# Altium footprint library LDCN Components.PcbLib: 426 footprints (part 23 of 27)
Each footprint in its own frame and in the unit in brackets; x right, y up, seen from the top. Pads: shape width x height; smd on the part's side, far side on the other; paste and mask are expansions set on the pad; w line width, h text height; cw(c..) or ccw(c..) is an arc to the next point about the centre after c.
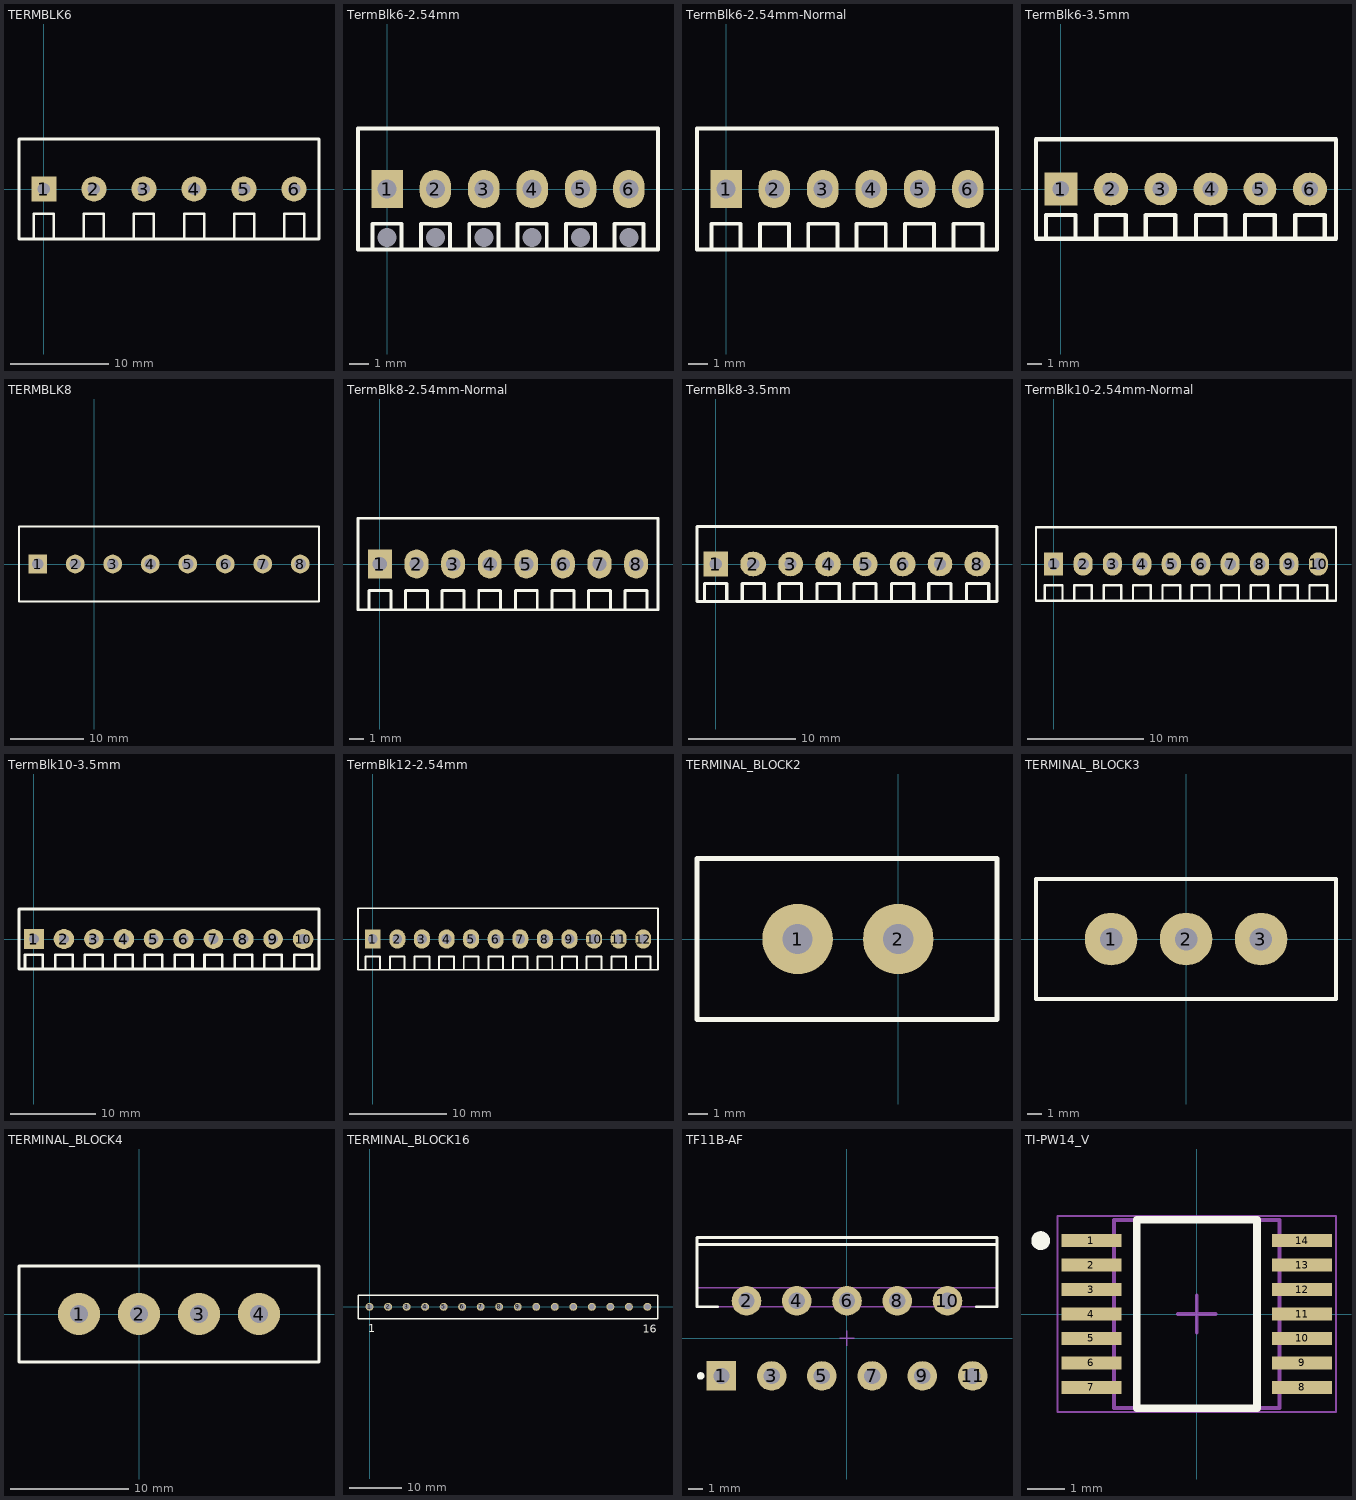
[diagram p22: the footprints below, top view; thin cyan lines are the x and y axes]

## TERMBLK6 [mm]
pads (6):
  rect 2.54x2.54 hole 1.27: 1(0,0)
  round 2.54 hole 1.27: 2(5.08,0) 3(10.16,0) 4(15.26,0) 5(20.34,0) 6(25.42,0)
Top Overlay:
  lines w0.254: -1.016,-5.08 -1.016,-2.54 1.016,-2.54 1.016,-5.08 ; 4.064,-5.08 4.064,-2.54 6.096,-2.54 6.096,-5.08 ; 9.144,-5.08 9.144,-2.54 11.176,-2.54 11.176,-5.08 ; 14.244,-5.08 14.244,-2.54 16.276,-2.54 16.276,-5.08 ; 19.324,-5.08 19.324,-2.54 21.356,-2.54 21.356,-5.08 ; 24.404,-5.08 24.404,-2.54 26.436,-2.54 26.436,-5.08
  lines w0.305: 12.7,-5.08 -2.54,-5.08 -2.54,5.08 12.7,5.08 ; 12.72,-5.08 27.96,-5.08 27.96,5.08 12.72,5.08

## TermBlk6-2.54mm [mm]
height 8
pads (12):
  rect 0x0 hole 1 unplated: 0(0,-2.54) 0(2.54,-2.54) 0(5.08,-2.54) 0(7.62,-2.54) 0(10.16,-2.54) 0(12.7,-2.54)
  rect 1.651x2 hole 1: 1(0,0)
  oval 1.651x2 hole 1: 2(2.54,0) 3(5.08,0) 4(7.62,0) 5(10.16,0) 6(12.7,0)
Top Overlay:
  lines w0.203: -0.762,-3.175 -0.762,-1.825 0.762,-1.825 0.762,-3.175 ; 1.778,-3.175 1.778,-1.825 3.302,-1.825 3.302,-3.175 ; 4.318,-3.175 4.318,-1.825 5.842,-1.825 5.842,-3.175 ; 6.858,-3.175 6.858,-1.825 8.382,-1.825 8.382,-3.175 ; 9.398,-3.175 9.398,-1.825 10.922,-1.825 10.922,-3.175 ; 11.938,-3.175 11.938,-1.825 13.462,-1.825 13.462,-3.175 ; -1.524,-3.175 14.224,-3.175 14.224,3.175 -1.524,3.175 -1.524,-3.175

## TermBlk6-2.54mm-Normal [mm]
height 8
pads (6):
  rect 1.651x2 hole 1: 1(0,0)
  oval 1.651x2 hole 1: 2(2.54,0) 3(5.08,0) 4(7.62,0) 5(10.16,0) 6(12.7,0)
Top Overlay:
  lines w0.203: -0.762,-3.175 -0.762,-1.825 0.762,-1.825 0.762,-3.175 ; 1.778,-3.175 1.778,-1.825 3.302,-1.825 3.302,-3.175 ; 4.318,-3.175 4.318,-1.825 5.842,-1.825 5.842,-3.175 ; 6.858,-3.175 6.858,-1.825 8.382,-1.825 8.382,-3.175 ; 9.398,-3.175 9.398,-1.825 10.922,-1.825 10.922,-3.175 ; 11.938,-3.175 11.938,-1.825 13.462,-1.825 13.462,-3.175 ; -1.524,-3.175 -1.524,3.175 14.224,3.175 14.224,-3.175 -1.524,-3.175

## TermBlk6-3.5mm [mm]
height 10
pads (6):
  rect 2.3x2.3 hole 1.15: 1(0,0)
  oval 2.4x2.3 hole 1.15: 2(3.5,0) 4(10.5,0) 6(17.47,0)
  round 2.3 hole 1.15: 3(7,0) 5(13.97,0)
Top Overlay:
  lines w0.305: -1.05,-3.5 -1.05,-1.825 1.025,-1.825 1.025,-3.5 ; 2.475,-3.5 2.475,-1.825 4.55,-1.825 4.55,-3.5 ; 5.95,-3.5 5.95,-1.825 8.025,-1.825 8.025,-3.5 ; 9.475,-3.5 9.475,-1.825 11.55,-1.825 11.55,-3.5 ; 12.92,-3.5 12.92,-1.825 14.995,-1.825 14.995,-3.5 ; 16.445,-3.5 16.445,-1.825 18.52,-1.825 18.52,-3.5 ; -1.75,-3.5 -1.75,3.5 19.304,3.5 19.304,-3.5 -1.75,-3.5

## TERMBLK8 [mil]
height 19
pads (8):
  rect 100x100 hole 60: 1(-300,0)
  round 100 hole 60: 2(-100,0) 3(100,0) 4(300,0) 5(500,0) 6(700,0) 7(900,0) 8(1100,0)
Top Overlay:
  lines w12: -400,-200 -400,200 1200,200 1200,-200 -400,-200

## TermBlk8-2.54mm-Normal [mm]
height 10
pads (8):
  rect 1.651x2 hole 1: 1(0,0)
  oval 1.651x2 hole 1: 2(2.54,0) 3(5.08,0) 4(7.62,0) 5(10.16,0) 6(12.7,0) 7(15.24,0) 8(17.78,0)
Top Overlay:
  lines w0.203: -0.762,-3.175 -0.762,-1.825 0.762,-1.825 0.762,-3.175 ; 1.778,-3.175 1.778,-1.825 3.302,-1.825 3.302,-3.175 ; 4.318,-3.175 4.318,-1.825 5.842,-1.825 5.842,-3.175 ; 6.858,-3.175 6.858,-1.825 8.382,-1.825 8.382,-3.175 ; 9.398,-3.175 9.398,-1.825 10.922,-1.825 10.922,-3.175 ; 11.938,-3.175 11.938,-1.825 13.462,-1.825 13.462,-3.175 ; 14.478,-3.175 14.478,-1.825 16.002,-1.825 16.002,-3.175 ; 17.018,-3.175 17.018,-1.825 18.542,-1.825 18.542,-3.175 ; -1.524,-3.175 19.304,-3.175 19.304,3.175 -1.524,3.175 -1.524,-3.175

## TermBlk8-3.5mm [mm]
height 10
pads (8):
  rect 2.3x2.3 hole 1.15: 1(0,0)
  oval 2.4x2.3 hole 1.15: 2(3.5,0) 4(10.5,0) 6(17.47,0) 8(24.47,0)
  round 2.3 hole 1.15: 3(7,0) 5(13.97,0) 7(20.97,0)
Top Overlay:
  lines w0.305: -1.05,-3.5 -1.05,-1.825 1.025,-1.825 1.025,-3.5 ; 2.475,-3.5 2.475,-1.825 4.55,-1.825 4.55,-3.5 ; 5.95,-3.5 5.95,-1.825 8.025,-1.825 8.025,-3.5 ; 9.475,-3.5 9.475,-1.825 11.55,-1.825 11.55,-3.5 ; 12.92,-3.5 12.92,-1.825 14.995,-1.825 14.995,-3.5 ; 16.445,-3.5 16.445,-1.825 18.52,-1.825 18.52,-3.5 ; 19.92,-3.5 19.92,-1.825 21.995,-1.825 21.995,-3.5 ; 23.445,-3.5 23.445,-1.825 25.52,-1.825 25.52,-3.5 ; -1.75,-3.5 -1.75,3.5 26.3,3.5 26.3,-3.5 -1.75,-3.5

## TermBlk10-2.54mm-Normal [mm]
height 10
pads (10):
  rect 1.651x2 hole 1: 1(0,0)
  oval 1.651x2 hole 1: 2(2.54,0) 3(5.08,0) 4(7.62,0) 5(10.16,0) 6(12.7,0) 7(15.24,0) 8(17.78,0) 9(20.32,0) 10(22.86,0)
Top Overlay:
  lines w0.203: -0.762,-3.175 -0.762,-1.825 0.762,-1.825 0.762,-3.175 ; 1.778,-3.175 1.778,-1.825 3.302,-1.825 3.302,-3.175 ; 4.318,-3.175 4.318,-1.825 5.842,-1.825 5.842,-3.175 ; 6.858,-3.175 6.858,-1.825 8.382,-1.825 8.382,-3.175 ; 9.398,-3.175 9.398,-1.825 10.922,-1.825 10.922,-3.175 ; 11.938,-3.175 11.938,-1.825 13.462,-1.825 13.462,-3.175 ; 14.478,-3.175 14.478,-1.825 16.002,-1.825 16.002,-3.175 ; 17.018,-3.175 17.018,-1.825 18.542,-1.825 18.542,-3.175 ; 19.558,-3.175 19.558,-1.825 21.082,-1.825 21.082,-3.175 ; 22.098,-3.175 22.098,-1.825 23.622,-1.825 23.622,-3.175 ; -1.524,-3.175 -1.524,3.175 24.384,3.175 24.384,-3.175 -1.524,-3.175

## TermBlk10-3.5mm [mm]
height 10
pads (10):
  rect 2.3x2.3 hole 1.15: 1(0,0)
  oval 2.4x2.3 hole 1.15: 2(3.5,0) 4(10.5,0) 6(17.47,0) 8(24.47,0) 10(31.44,0)
  round 2.3 hole 1.15: 3(7,0) 5(13.97,0) 7(20.97,0) 9(27.94,0)
Top Overlay:
  lines w0.305: -1.05,-3.5 -1.05,-1.825 1.025,-1.825 1.025,-3.5 ; 2.475,-3.5 2.475,-1.825 4.55,-1.825 4.55,-3.5 ; 5.95,-3.5 5.95,-1.825 8.025,-1.825 8.025,-3.5 ; 9.475,-3.5 9.475,-1.825 11.55,-1.825 11.55,-3.5 ; 12.92,-3.5 12.92,-1.825 14.995,-1.825 14.995,-3.5 ; 16.445,-3.5 16.445,-1.825 18.52,-1.825 18.52,-3.5 ; 19.92,-3.5 19.92,-1.825 21.995,-1.825 21.995,-3.5 ; 23.445,-3.5 23.445,-1.825 25.52,-1.825 25.52,-3.5 ; 26.89,-3.5 26.89,-1.825 28.965,-1.825 28.965,-3.5 ; 30.415,-3.5 30.415,-1.825 32.49,-1.825 32.49,-3.5 ; -1.75,-3.5 33.3,-3.5 33.3,3.5 -1.75,3.5 -1.75,-3.5

## TermBlk12-2.54mm [mm]
height 10
pads (12):
  rect 1.651x2 hole 1: 1(0,0)
  oval 1.651x2 hole 1: 2(2.54,0) 3(5.08,0) 4(7.62,0) 5(10.16,0) 6(12.7,0) 7(15.24,0) 8(17.78,0) 9(20.32,0) 10(22.86,0) 11(25.4,0) 12(27.94,0)
Top Overlay:
  lines w0.203: -0.762,-3.175 -0.762,-1.825 0.762,-1.825 0.762,-3.175 ; 1.778,-3.175 1.778,-1.825 3.302,-1.825 3.302,-3.175 ; 4.318,-3.175 4.318,-1.825 5.842,-1.825 5.842,-3.175 ; 6.858,-3.175 6.858,-1.825 8.382,-1.825 8.382,-3.175 ; 9.398,-3.175 9.398,-1.825 10.922,-1.825 10.922,-3.175 ; 11.938,-3.175 11.938,-1.825 13.462,-1.825 13.462,-3.175 ; 14.478,-3.175 14.478,-1.825 16.002,-1.825 16.002,-3.175 ; 17.018,-3.175 17.018,-1.825 18.542,-1.825 18.542,-3.175 ; 19.558,-3.175 19.558,-1.825 21.082,-1.825 21.082,-3.175 ; 22.098,-3.175 22.098,-1.825 23.622,-1.825 23.622,-3.175 ; 24.638,-3.175 24.638,-1.825 26.162,-1.825 26.162,-3.175 ; 27.178,-3.175 27.178,-1.825 28.702,-1.825 28.702,-3.175 ; -1.524,-3.175 -1.524,3.175 29.464,3.175 29.464,-3.175 -1.524,-3.175

## TERMINAL_BLOCK2 [mil]
pads (2):
  round 140 hole 60: 1(-200,0) 2(0,0)
Top Overlay:
  lines w10: 196.25,-160 -400,-160 -400,160 196.25,160 196.25,-158.75

## TERMINAL_BLOCK3 [mil]
pads (3):
  round 140 hole 60: 1(-200,0) 2(0,0) 3(200,0)
Top Overlay:
  lines w10: -400,-160 400,-160 400,160 -400,160 -400,-160

## TERMINAL_BLOCK4 [mil]
pads (4):
  round 140 hole 60: 1(-200,0) 2(0,0) 3(200,0) 4(400,0)
Top Overlay:
  lines w10: -400,-160 600,-160 600,160 -400,160 -400,-160

## TERMINAL_BLOCK16 [mm]
pads (16):
  round 1.5 hole 1.1: 1(0,0) 2(3.5,0) 3(7,0) 4(10.5,0) 5(14,0) 6(17.5,0) 7(21,0) 8(24.5,0) 9(28,0) 10(31.5,0) 11(35,0) 12(38.5,0) 13(42,0) 14(45.5,0) 15(49,0) 16(52.5,0)
Top Overlay:
  lines w0.254: -2.185,-2.22 54.505,-2.22 54.505,2.2 -2.185,2.2 -2.185,-2.22
  text "1" at -0.295,-4.77 h1.52
  text "16" at 51.615,-4.925 h1.52

## TF11B-AF [mm] "TO, Thru-Hole, Vertical, Heatsink Mounted; 11 Bent Staggered Leads; Pitch 1.7 mm"
height 23
pads (11):
  rect 2x2 hole 1.1: 1(-8.5,-2.54)
  round 2 hole 1.1: 2(-6.8,2.54) 3(-5.1,-2.54) 4(-3.4,2.54) 5(-1.7,-2.54) 6(0,2.54) 7(1.7,-2.54) 8(3.4,2.54) 9(5.1,-2.54) 10(6.8,2.54) 11(8.5,-2.54)
Top Overlay:
  circle w0.25: c-9.9,-2.54 r0.125
  lines w0.2: -10.15,6.34 10.15,6.34 ; -8.754,2.14 -10.15,2.14 -10.15,6.84 10.15,6.84 10.15,2.14 8.774,2.14
Mechanical 13:
  lines w0.1: -10.15,3.41 10.15,3.41 ; -10.15,2.14 -10.15,6.84 10.15,6.84 10.15,2.14 -10.15,2.14
Mechanical 15:
  lines w0.1: -0.5,0 0.5,0 ; 0,-0.5 0,0.5
3D body: height 14, standoff 3.3, extent -10.149,2.141 10.149,6.839
3D body: height 23, standoff 14, extent -10.149,3.411 10.149,6.839

## TI-PW14_V [mm] "TSSOP, 14-Leads, Body 4.4x5mm, Pitch 0.65mm"
height 1.2
pads (14):
  rect 1.6x0.35 smd paste-0.025 mask+0.07: 1(-2.8,1.95) 2(-2.8,1.3) 3(-2.8,0.65) 4(-2.8,0) 5(-2.8,-0.65) 6(-2.8,-1.3) 7(-2.8,-1.95) 8(2.8,-1.95) 9(2.8,-1.3) 10(2.8,-0.65) 11(2.8,0) 12(2.8,0.65) 13(2.8,1.3) 14(2.8,1.95)
Top Overlay:
  circle w0.25: c-4.15,1.95 r0.125
  lines w0.2: -1.6,-2.5 1.6,-2.5 1.6,2.5 -1.6,2.5 -1.6,-2.5
Mechanical 13:
  lines w0.1: -2.2,-2.5 -2.2,2.5 2.2,2.5 2.2,-2.5 -2.2,-2.5
Mechanical 15:
  lines w0.05: -3.7,-2.6 -3.7,2.6 3.7,2.6 3.7,-2.6 -3.7,-2.6
  lines w0.1: -0.5,0 0.5,0 ; 0,-0.5 0,0.5
3D body: height 1.2, standoff 0.05, extent -2.2,-2.5 2.2,2.5